# Altium footprint library myPcbLib2.PcbLib: 56 footprints (part 1 of 4)
Each footprint in its own frame and in the unit in brackets; x right, y up, seen from the top. Pads: shape width x height; smd on the part's side, far side on the other; paste and mask are expansions set on the pad; w line width, h text height; cw(c..) or ccw(c..) is an arc to the next point about the centre after c.
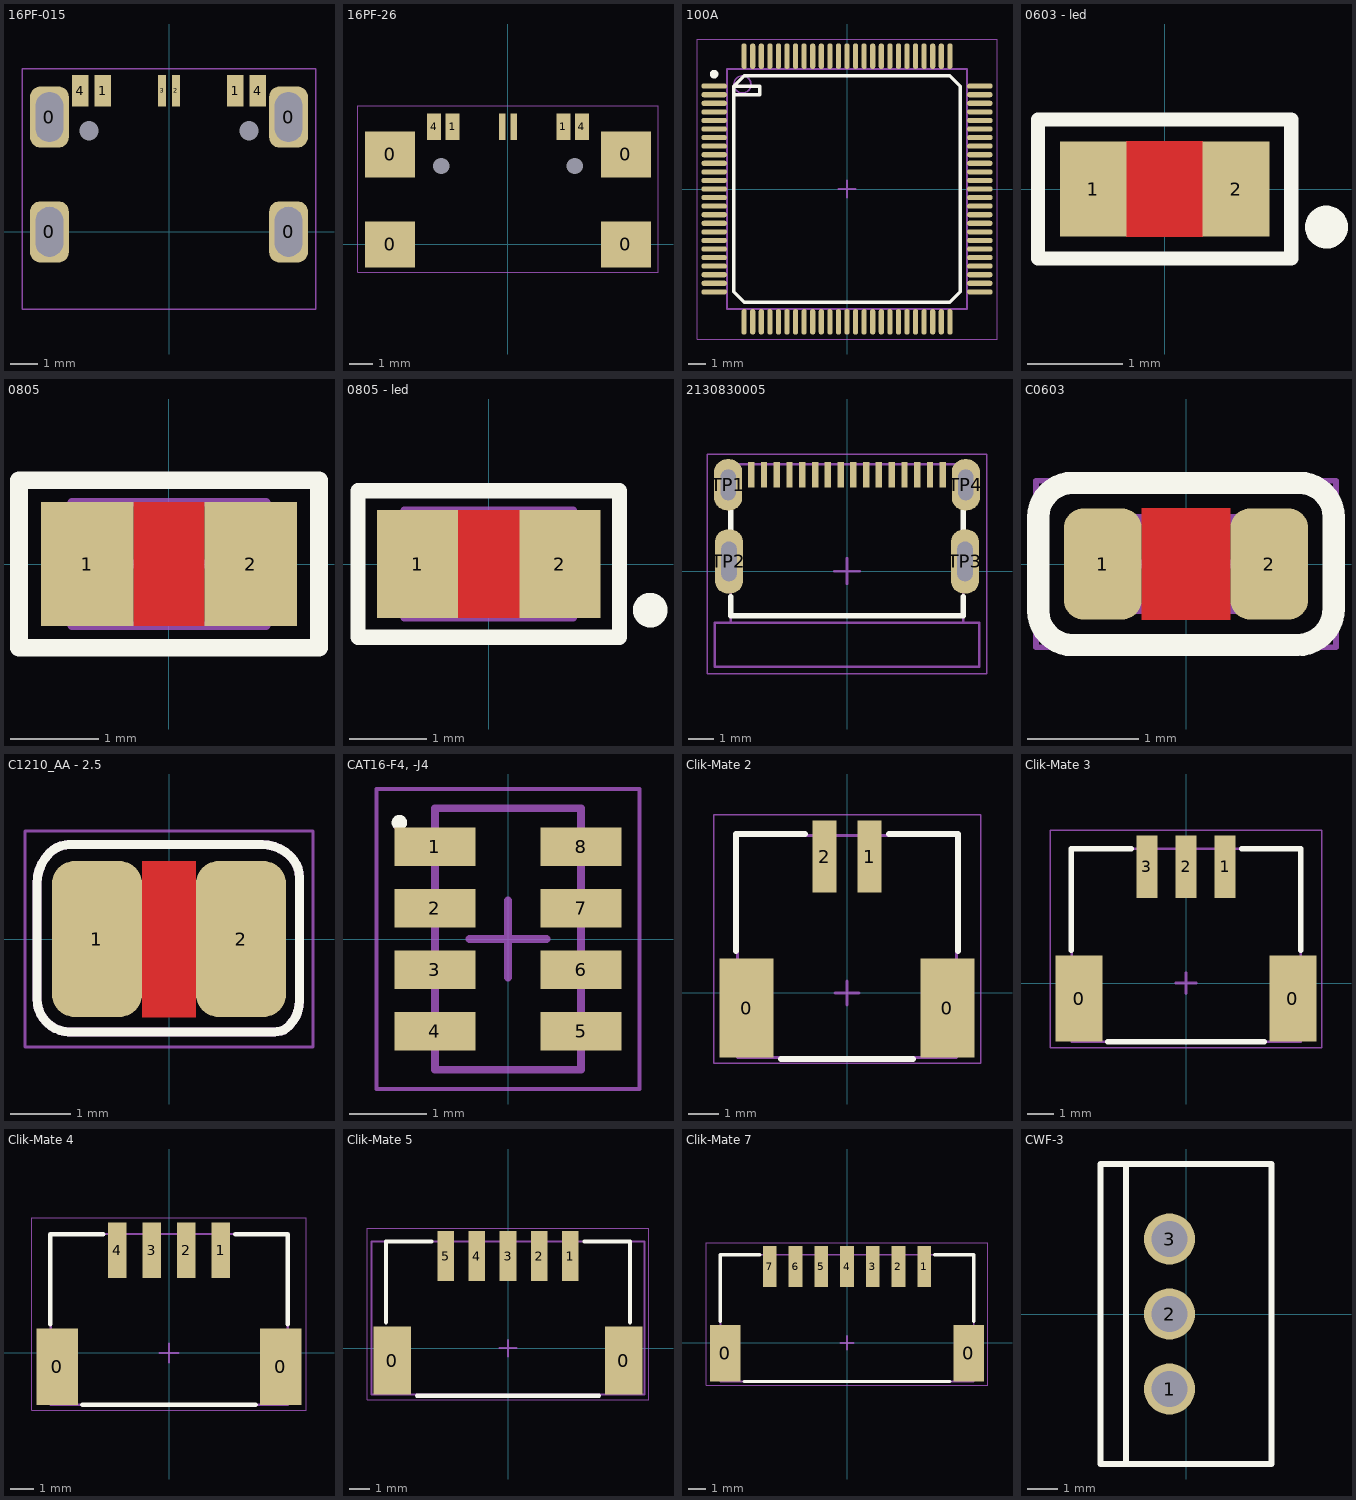
[diagram p0: the footprints below, top view; thin cyan lines are the x and y axes]

## 16PF-015 [mm] "USB-Type C"
pads (12):
  rrect50% 1.4x2.2 hole 1 slot 1.8 at 90 deg: 0(-4.32,0) 0(-4.32,4.15) 0(4.32,0) 0(4.32,4.15)
  rect 0.6x1.15 smd: 1(-2.4,5.1) 1(2.4,5.1) 4(-3.2,5.1) 4(3.2,5.1)
  rect 0.3x1.15 smd: 2(0.25,5.1) 3(-0.25,5.1)
  oval 0x0.35 hole 0.7: -1(-2.89,3.65) -1(2.89,3.65)
Top Mechanical 9/Mechanical 10:
  text ".Designator" at -2.523,2.116 h1.52
  text ".Comment" at -2.523,0.956 h1.52
Mechanical 15:
  lines w0.05: -5.3,-2.8 5.3,-2.8 5.3,5.9 -5.3,5.9 -5.3,-2.8
3D body "cu32s09sa_cu3216sasdlr009-nh_.stp": height 3.25, standoff -0.91, extent -4.47,-2.649 4.47,4.927

## 16PF-26 [mm] "USB-Type C"
pads (12):
  rect 2.18x2 smd: 0(-5.11,0) 0(-5.11,3.9) 0(5.11,0) 0(5.11,3.9)
  rect 0.6x1.15 smd: 1(-2.4,5.1) 1(2.4,5.1) 4(-3.2,5.1) 4(3.2,5.1)
  rect 0.3x1.15 smd: 2(0.25,5.1) 3(-0.25,5.1)
  oval 0x0.35 hole 0.7: -1(-2.89,3.4) -1(2.89,3.4)
Top Mechanical 9/Mechanical 10:
  text ".Comment" at -2.523,0.656 h1.52
  text ".Designator" at -2.523,1.816 h1.52
Mechanical 15:
  lines w0.05: -6.5,-1.2 6.5,-1.2 6.5,6 -6.5,6 -6.5,-1.2

## 100A [mm] "atmega2560"
height 1.2
pads (100):
  oval 1.5x0.3 smd: 1(-7.75,6) 2(-7.75,5.5) 3(-7.75,5) 4(-7.75,4.5) 5(-7.75,4) 6(-7.75,3.5) 7(-7.75,3) 8(-7.75,2.5) 9(-7.75,2) 10(-7.75,1.5) 11(-7.75,1) 12(-7.75,0.5) 13(-7.75,0) 14(-7.75,-0.5) 15(-7.75,-1) 16(-7.75,-1.5) 17(-7.75,-2) 18(-7.75,-2.5) 19(-7.75,-3) 20(-7.75,-3.5) 21(-7.75,-4) 22(-7.75,-4.5) 23(-7.75,-5) 24(-7.75,-5.5) 25(-7.75,-6) 51(7.75,-6) 52(7.75,-5.5) 53(7.75,-5) 54(7.75,-4.5) 55(7.75,-4) 56(7.75,-3.5) 57(7.75,-3) 58(7.75,-2.5) 59(7.75,-2) 60(7.75,-1.5) 61(7.75,-1) 62(7.75,-0.5) 63(7.75,0) 64(7.75,0.5) 65(7.75,1) 66(7.75,1.5) 67(7.75,2) 68(7.75,2.5) 69(7.75,3) 70(7.75,3.5) 71(7.75,4) 72(7.75,4.5) 73(7.75,5) 74(7.75,5.5) 75(7.75,6)
  oval 0.3x1.5 smd: 26(-6,-7.75) 27(-5.5,-7.75) 28(-5,-7.75) 29(-4.5,-7.75) 30(-4,-7.75) 31(-3.5,-7.75) 32(-3,-7.75) 33(-2.5,-7.75) 34(-2,-7.75) 35(-1.5,-7.75) 36(-1,-7.75) 37(-0.5,-7.75) 38(0,-7.75) 39(0.5,-7.75) 40(1,-7.75) 41(1.5,-7.75) 42(2,-7.75) 43(2.5,-7.75) 44(3,-7.75) 45(3.5,-7.75) 46(4,-7.75) 47(4.5,-7.75) 48(5,-7.75) 49(5.5,-7.75) 50(6,-7.75) 76(6,7.75) 77(5.5,7.75) 78(5,7.75) 79(4.5,7.75) 80(4,7.75) 81(3.5,7.75) 82(3,7.75) 83(2.5,7.75) 84(2,7.75) 85(1.5,7.75) 86(1,7.75) 87(0.5,7.75) 88(0,7.75) 89(-0.5,7.75) 90(-1,7.75) 91(-1.5,7.75) 92(-2,7.75) 93(-2.5,7.75) 94(-3,7.75) 95(-3.5,7.75) 96(-4,7.75) 97(-4.5,7.75) 98(-5,7.75) 99(-5.5,7.75) 100(-6,7.75)
Top Overlay:
  circle w0.25: c-7.75,6.7 r0.125
  lines w0.2: -6.6,5.5 -5.1,5.5 -5.1,6 -6.6,6 ; -6.6,6 -6,6.6 6,6.6 6.6,6 6.6,-6 6,-6.6 -6,-6.6 -6.6,-6 -6.6,6
Top Mechanical 9/Mechanical 10:
  text ".Designator" at -4.398,5.216 h1.52
  text ".Comment" at -4.398,4.056 h1.52
Top Mechanical 13/Mechanical 14:
  circle w0.1: c-6.1,6.1 r0.5
  lines w0.1: -7,-7 7,-7 7,7 -7,7 -7,-7
Mechanical 15:
  lines w0.05: -8.75,-8.75 8.75,-8.75 8.75,8.75 -8.75,8.75 -8.75,-8.75
  lines w0.1: -0.5,0 0.5,0 ; 0,-0.5 0,0.5
3D body "CQFP50P1600X1600X120-100N.step": height 1.15, standoff 0, extent -8.125,-8.125 8.125,8.125

## 0603 - led [mm]
height 0.45
pads (2):
  rect 0.7x1 smd: 1(-0.75,0) 2(0.75,0)
Top Layer:
  pour cut-out: -0.4,0.5 0.4,0.5 0.4,-0.5 -0.4,-0.5
Top Overlay:
  circle w0.25: c1.7,-0.4 r0.1
  lines w0.15: -1.33,-0.73 -1.33,0.73 1.33,0.73 1.33,-0.73 -1.33,-0.73
Top Mechanical 9/Mechanical 10:
  text ".Comment" at -0.9,-0.525 h0.6
  text ".Designator" at -1.125,0.075 h0.8
Top Mechanical 11/Mechanical 12:
  lines w0.1: -0.85,-0.4 0.75,-0.4 0.75,0.4 -0.85,0.4 -0.85,-0.4
Mechanical 15:
  lines w0.05: -1.35,-0.75 1.35,-0.75 1.35,0.75 -1.35,0.75 -1.35,-0.75
  lines w0.1: -0.375,0 0.375,0 ; 0,-0.375 0,0.375
3D body "User Library-LED SMD0603.step": height 0.68, standoff 0, extent -0.825,-0.368 0.825,0.357

## 0805 [mm] "Chip Resistor, 2-Leads, Body 2,10x1,30mm, IPC Medium Density"
height 0.55
pads (2):
  rect 1.05x1.4 smd: 1(-0.925,0) 2(0.925,0)
Top Layer:
  pour cut-out: -0.4,0.7 0.4,0.7 0.4,-0.7 -0.4,-0.7
Top Overlay:
  lines w0.2: -1.7,-0.95 1.7,-0.95 1.7,0.95 -1.7,0.95 -1.7,-0.95
Top Mechanical 9/Mechanical 10:
  text ".Designator" at -1.325,0.175 h0.8
  text ".Comment" at -1.075,-0.375 h0.6
Top Mechanical 11/Mechanical 12:
  lines w0.1: -1.1,-0.7 1.1,-0.7 1.1,0.7 -1.1,0.7 -1.1,-0.7
Mechanical 15:
  lines w0.05: -1.7,-0.95 -1.7,0.95 1.7,0.95 1.7,-0.95 -1.7,-0.95
  lines w0.1: -0.5,0 0.5,0 ; 0,-0.5 0,0.5
3D body "R0805.step": height 0.55, standoff 0, extent -1.2,-0.625 1.2,0.625

## 0805 - led [mm] "Chip Resistor, 2-Leads, Body 2,10x1,30mm, IPC Medium Density"
height 0.55
pads (2):
  rect 1.05x1.4 smd: 1(-0.925,0) 2(0.925,0)
Top Layer:
  pour cut-out: -0.4,0.7 0.4,0.7 0.4,-0.7 -0.4,-0.7
Top Overlay:
  circle w0.25: c2.1,-0.6 r0.1
  lines w0.2: -1.7,-0.95 1.7,-0.95 1.7,0.95 -1.7,0.95 -1.7,-0.95
Top Mechanical 9/Mechanical 10:
  text ".Designator" at -1.325,0.175 h0.8
  text ".Comment" at -1.075,-0.375 h0.6
Top Mechanical 11/Mechanical 12:
  lines w0.1: -1.1,-0.7 1.1,-0.7 1.1,0.7 -1.1,0.7 -1.1,-0.7
Mechanical 15:
  lines w0.05: -1.7,-0.95 -1.7,0.95 1.7,0.95 1.7,-0.95 -1.7,-0.95
  lines w0.1: -0.5,0 0.5,0 ; 0,-0.5 0,0.5
3D body "User Library-LED SMD0805.step": height 0.85, standoff 0.01, extent -1.031,-0.46 1.031,0.446

## 2130830005 [mm] "*"
height 4
pads (20):
  rect 0.25x1 smd: A1(-3.75,3.775) A4(-2.75,3.775) A5(-1.75,3.775) A6(-0.75,3.775) A7(0.75,3.775) A8(1.75,3.775) A9(2.75,3.775) A12(3.75,3.775) B1(3.25,3.775) B4(2.25,3.775) B5(1.25,3.775) B6(0.25,3.775) B7(-0.25,3.775) B8(-1.25,3.775) B9(-2.25,3.775) B12(-3.25,3.775)
  rrect90% 1.1x2 hole 0.6 slot 1.2 at 90 deg: TP1(-4.649,3.375) TP4(4.65,3.375)
  rrect90% 1.1x2.5 hole 0.6 slot 1.55 at 90 deg: TP2(-4.62,0.375) TP3(4.62,0.375)
Top Overlay:
  lines w0.2: -4.549,-1 -4.549,-1.75 4.549,-1.75 4.549,-1 ; -4.549,1.625 -4.549,2.375 ; 4.549,1.625 4.549,2.375
Top Component Outline:
  lines w0.1: -5.175,-3.75 -5.175,-2.025 5.175,-2.025 5.175,-3.75 -5.175,-3.75 ; -4.549,-2.025 4.549,-2.025 4.549,4.175 -4.549,4.175 -4.549,-2.025
Top Designator:
  text ".Designator" at -2.339,-0.265 h1.2
Top Mechanical 7/Mechanical 8:
  text ".Comment" at -2.066,-1.475 h1.2
Top Courtyard:
  lines w0.05: -5.47,-4.025 -5.47,4.575 5.47,4.575 5.47,-4.025 -5.47,-4.025
  lines w0.1: -0.5,0 0.5,0 ; 0,-0.5 0,0.5
3D body "2130830005 (USB Type-C).stp": height 3.88, standoff -1.08, extent -5.17,-3.725 5.17,4.175

## C0603 [mm]
height 0.9
pads (2):
  rrect50% 0.7x1 smd: 1(-0.75,0) 2(0.75,0)
Top Layer:
  pour cut-out: -0.4,0.5 0.4,0.5 0.4,-0.5 -0.4,-0.5
Top Overlay:
  lines w0.2: -1.33,-0.42 ccw(c-1.02,-0.42) -1.02,-0.73 1,-0.73 ccw(c1,-0.4) 1.33,-0.4 1.33,0.42 ccw(c1.02,0.42) 1.02,0.73 -1.02,0.73 ccw(c-1.02,0.42) -1.33,0.42 -1.33,-0.42
Top Mechanical 9/Mechanical 10:
  text ".Comment" at -0.925,-0.4 h0.6
  text ".Designator" at -1.05,0.15 h0.8
Top Mechanical 11/Mechanical 12:
  lines w0.1: -0.8,-0.4 -0.8,0.4 0.8,0.4 0.8,-0.4 -0.8,-0.4
Mechanical 15:
  lines w0.05: -1.35,-0.75 -1.35,0.75 1.35,0.75 1.35,-0.75 -1.35,-0.75
  lines w0.1: -0.375,0 0.375,0 ; 0,-0.4 0,0.4
3D body "CAPC0603.STEP": height 0.9, standoff 0, extent -0.8,-0.4 0.8,0.4

## C1210_AA - 2.5 [mm]
height 2.5
pads (2):
  rrect50% 1.5x2.6 smd: 1(-1.2,0) 2(1.2,0)
Top Layer:
  pour cut-out: -0.45,1.3 0.45,1.3 0.45,-1.3 -0.45,-1.3
Top Overlay:
  lines w0.15: -2.2,-1 ccw(c-1.657,-1) -2.041,-1.384 -2.034,-1.391 ccw(c-1.65,-1.007) -1.65,-1.55 ; -2.2,-0.975 -2.2,0.925 cw(c-1.476,0.925) -1.988,1.437 cw(c-1.655,1.104) -1.655,1.575 ; -1.675,1.575 1.55,1.575 cw(c1.55,0.911) 2.019,1.381 2.034,1.366 cw(c1.692,1.025) 2.175,1.025 2.175,-1.028 cw(c1.578,-1.028) 2,-1.45 cw(c1.759,-1.209) 1.759,-1.55 -1.575,-1.55 ; -1.673,-1.55 -1.55,-1.55
Top Mechanical 9/Mechanical 10:
  text ".Comment" at 0.15,-0.7 h0.6
  text ".Designator" at -0.2,0.5 h0.8
Top Mechanical 11/Mechanical 12:
  lines w0.15: -2.2,-1 ccw(c-1.657,-1) -2.041,-1.384 -2.034,-1.391 ccw(c-1.65,-1.007) -1.65,-1.55 ; -2.2,-0.975 -2.2,0.925 cw(c-1.476,0.925) -1.988,1.437 cw(c-1.655,1.104) -1.655,1.575 ; -1.675,1.575 1.55,1.575 cw(c1.55,0.911) 2.019,1.381 2.034,1.366 cw(c1.692,1.025) 2.175,1.025 2.175,-1.028 cw(c1.578,-1.028) 2,-1.45 cw(c1.759,-1.209) 1.759,-1.55 -1.575,-1.55 ; -1.673,-1.55 -1.55,-1.55
Mechanical 15:
  lines w0.05: -2.4,-1.8 2.4,-1.8 2.4,1.8 -2.4,1.8 -2.4,-1.8
3D body "GRM32ER71E226ME15L.STEP": height 2.5, standoff 0, extent -1.6,-1.25 1.6,1.25

## CAT16-F4, -J4 [mm] "x4 Resistors"
height 0.6
pads (8):
  rect 1.05x0.5 smd: 1(-0.95,1.2) 2(-0.95,0.4) 3(-0.95,-0.4) 4(-0.95,-1.2) 5(0.95,-1.2) 6(0.95,-0.4) 7(0.95,0.4) 8(0.95,1.2)
Top Overlay:
  circle w0.1: c-1.412,1.513 r0.05
Top Mechanical 13/Mechanical 14:
  lines w0.1: -0.95,-1.7 0.95,-1.7 0.95,1.7 -0.95,1.7 -0.95,-1.7
Mechanical 15:
  lines w0.05: -1.71,-1.95 1.71,-1.95 1.71,1.95 -1.71,1.95 -1.71,-1.95
  lines w0.1: -0.5,0 0.5,0 ; 0,-0.5 0,0.5
3D body "R0603x4.STEP": height 0.5, standoff 0, extent -0.8,-1.6 0.8,1.6

## Clik-Mate 2 [mm]
pads (4):
  rect 1.8x3.3 smd: 0(-3.35,-0.5) 0(3.35,-0.5)
  rect 0.8x2.4 smd: 1(0.75,4.55) 2(-0.75,4.55)
Top Overlay:
  lines w0.2: -3.7,1.4 -3.7,5.3 -1.4,5.3 ; -2.2,-2.2 2.2,-2.2 ; 1.4,5.3 3.7,5.3 3.7,1.4
Top Mechanical 9/Mechanical 10:
  text ".Comment" at -1.27,-0.508 h0.6
  text ".Designator" at -1.778,0.381 h0.8
Top Mechanical 11/Mechanical 12:
  lines w0.1: -3.65,-2.15 3.65,-2.15 3.65,5.25 -3.65,5.25 -3.65,-2.15
Mechanical 15:
  lines w0.05: -4.45,-2.35 4.45,-2.35 4.45,5.95 -4.45,5.95 -4.45,-2.35
  lines w0.1: -0.4,0 0.4,0 ; 0,-0.4 0,0.4
3D body "Click-Mate_2.stp": height 7.58, standoff 0.28, extent -3.65,-2.15 3.65,5.25

## Clik-Mate 3 [mm] "5054050370"
pads (5):
  rect 1.8x3.3 smd: 0(-4.1,-0.6) 0(4.1,-0.6)
  rect 0.8x2.4 smd: 1(1.5,4.45) 2(0,4.45) 3(-1.5,4.45)
Top Overlay:
  lines w0.2: -4.4,1.25 -4.4,5.15 -2.1,5.15 ; -3,-2.25 3,-2.25 ; 2.125,5.15 4.4,5.15 4.4,1.25
Top Mechanical 9/Mechanical 10:
  text ".Comment" at -0.925,-0.4 h0.6
  text ".Designator" at -1.05,0.15 h0.8
Top Mechanical 11/Mechanical 12:
  lines w0.1: -4.375,-2.25 4.4,-2.25 4.4,5.15 -4.375,5.15 -4.375,-2.25
Mechanical 15:
  lines w0.05: -5.2,-2.475 5.2,-2.475 5.2,5.85 -5.2,5.85 -5.2,-2.475
  lines w0.1: -0.4,0 0.4,0 ; 0,-0.4 0,0.4
3D body "click-mate 3.stp": height 7.28, standoff -0.02, extent -4.4,-2.25 4.4,5.15

## Clik-Mate 4 [mm] "5054050470"
pads (6):
  rect 1.8x3.3 smd: 0(-4.85,-0.6) 0(4.85,-0.6)
  rect 0.8x2.4 smd: 1(2.25,4.45) 2(0.75,4.45) 3(-0.75,4.45) 4(-2.25,4.45)
Top Overlay:
  lines w0.2: -5.15,1.25 -5.15,5.15 -2.85,5.15 ; -3.75,-2.25 3.75,-2.25 ; 2.875,5.15 5.15,5.15 5.15,1.25
Top Mechanical 9/Mechanical 10:
  text ".Comment" at -0.925,-0.4 h0.6
  text ".Designator" at -1.05,0.15 h0.8
Top Mechanical 11/Mechanical 12:
  lines w0.1: -5.125,-2.25 5.15,-2.25 5.15,5.15 -5.125,5.15 -5.125,-2.25
Mechanical 15:
  lines w0.05: -5.95,-2.475 5.95,-2.475 5.95,5.85 -5.95,5.85 -5.95,-2.475
  lines w0.1: -0.4,0 0.4,0 ; 0,-0.4 0,0.4
3D body "Clik-Mate 4.stp": height 7.28, standoff -0.02, extent -5.15,-2.25 5.15,5.15

## Clik-Mate 5 [mm] "5054050670"
pads (7):
  rect 1.8x3.3 smd: 0(-5.6,-0.6) 0(5.6,-0.6)
  rect 0.8x2.4 smd: 1(3,4.45) 2(1.5,4.45) 3(0,4.45) 4(-1.5,4.45) 5(-3,4.45)
Top Overlay:
  lines w0.2: -5.9,1.25 -5.9,5.15 -3.7,5.15 ; -4.4,-2.3 4.4,-2.3 ; 3.7,5.15 5.9,5.15 5.9,1.25
Top Mechanical 9/Mechanical 10:
  text ".Comment" at -0.925,-0.4 h0.6
  text ".Designator" at -1.05,0.15 h0.8
Top Mechanical 11/Mechanical 12:
  lines w0.1: -6.6,-2.25 -6.6,5.15 6.6,5.15 6.6,-2.25 -6.6,-2.25
Mechanical 15:
  lines w0.05: -6.8,-2.5 6.8,-2.5 6.8,5.8 -6.8,5.8 -6.8,-2.5
  lines w0.1: -0.4,0 0.4,0 ; 0,-0.4 0,0.4
3D body "2132250510.stp": height 7.28, standoff -0.02, extent -5.9,-2.2 5.9,5.2

## Clik-Mate 7 [mm] "505405-0770"
pads (9):
  rect 1.8x3.3 smd: 0(-7.1,-0.6) 0(7.1,-0.6)
  rect 0.8x2.4 smd: 1(4.5,4.45) 2(3,4.45) 3(1.5,4.45) 4(0,4.45) 5(-1.5,4.45) 6(-3,4.45) 7(-4.5,4.45)
Top Overlay:
  lines w0.2: -7.4,1.25 -7.4,5.15 -5.1,5.15 ; -6,-2.25 6,-2.25 ; 5.125,5.15 7.4,5.15 7.4,1.25
Top Mechanical 9/Mechanical 10:
  text ".Designator" at -1.05,0.15 h0.8
  text ".Comment" at -0.925,-0.4 h0.6
Top Mechanical 11/Mechanical 12:
  lines w0.1: -7.375,-2.25 -7.375,5.15 7.4,5.15 7.4,-2.25 -7.375,-2.25
Mechanical 15:
  lines w0.05: -8.2,-2.475 -8.2,5.85 8.2,5.85 8.2,-2.475 -8.2,-2.475
  lines w0.1: -0.4,0 0.4,0 ; 0,-0.4 0,0.4
3D body "Clik-Mate 7.stp": height 7.28, standoff -0.02, extent -7.4,-2.25 7.4,5.15

## CWF-3 [mm]
pads (3):
  round 1.7 hole 1.2: 1(-0.55,-2.5) 2(-0.55,0) 3(-0.55,2.5)
Top Overlay:
  lines w0.2: -2,-5 -2,5 ; -2.85,-5 -2.85,5 2.85,5 2.85,-5 -2.85,-5
Top Designator:
  text ".Designator" at -1.456,-0.508 h0.8
3D body "CWF_3_V.STEP": height 7.7, standoff -1, extent -2.9,-5 2.8,5